# Altium footprint library Toi Library.PcbLib: 740 footprints (part 35 of 47)
Each footprint in its own frame and in the unit in brackets; x right, y up, seen from the top. Pads: shape width x height; smd on the part's side, far side on the other; paste and mask are expansions set on the pad; w line width, h text height; cw(c..) or ccw(c..) is an arc to the next point about the centre after c.
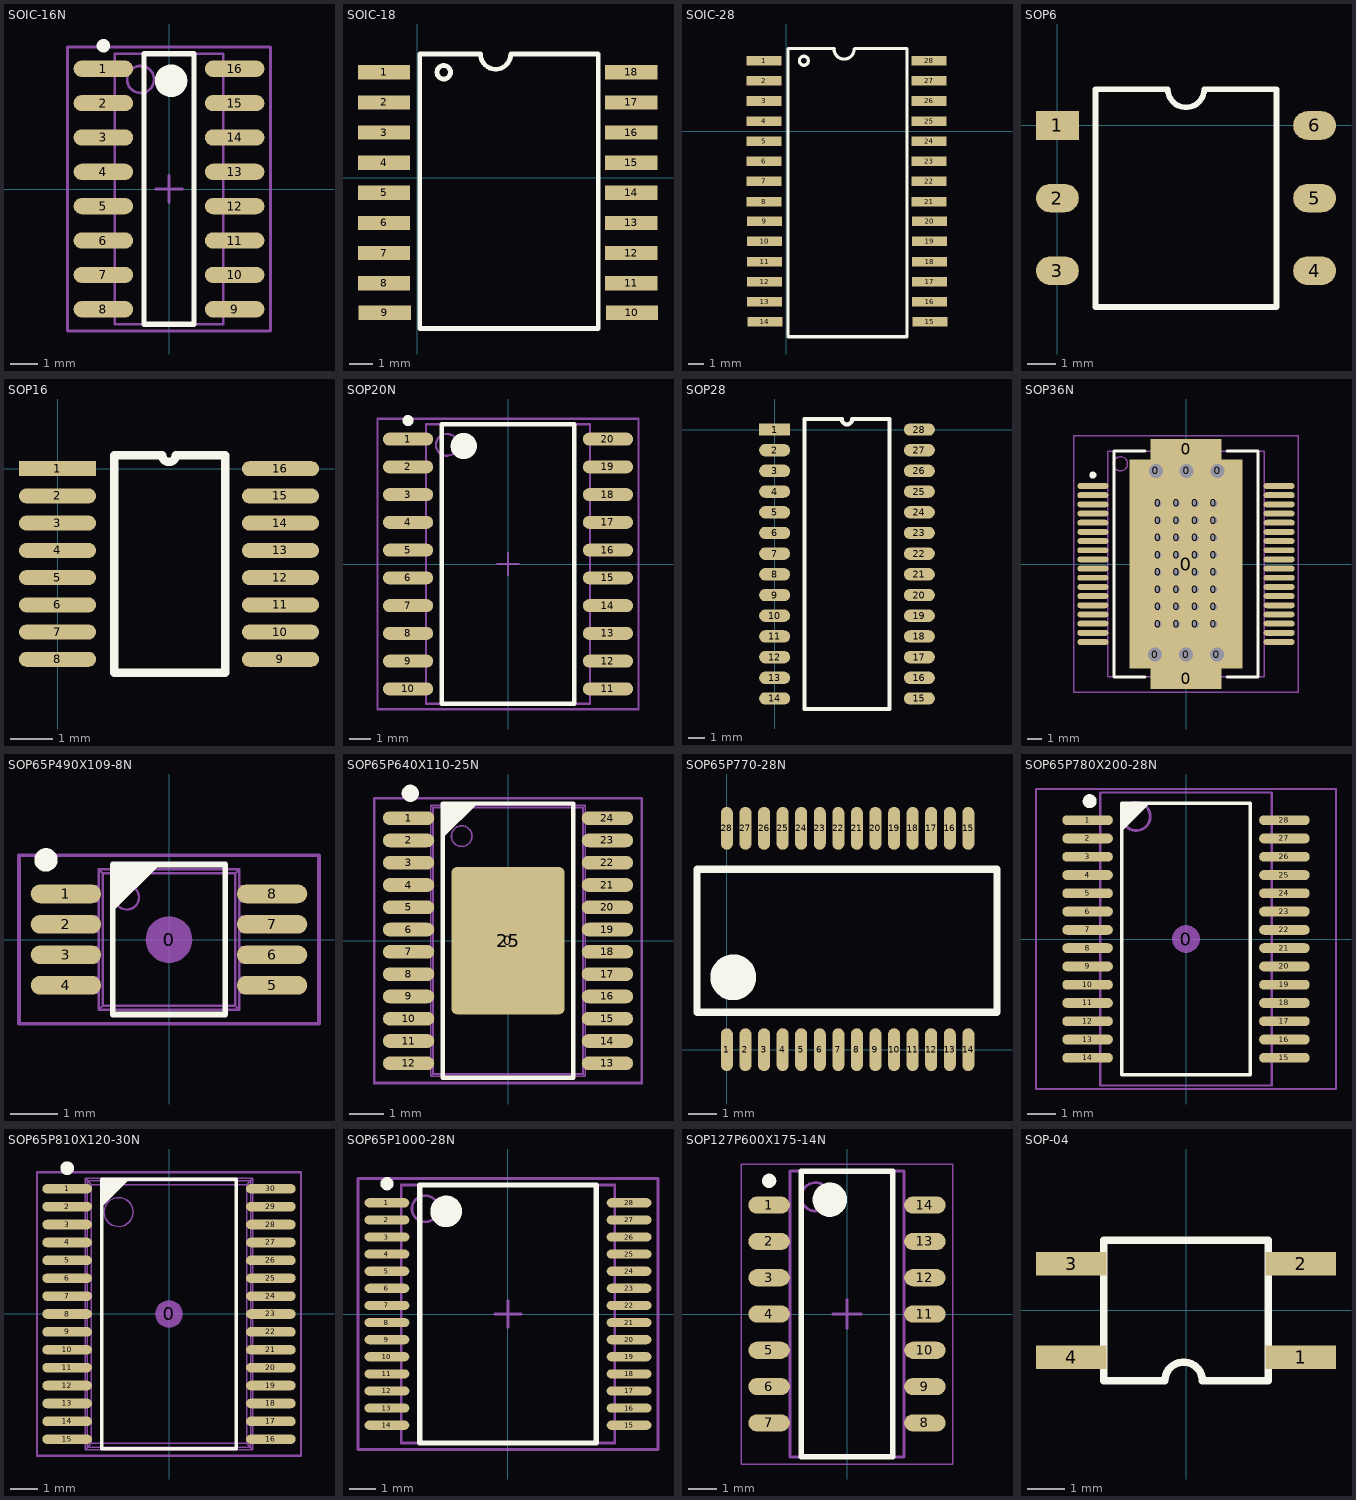
[diagram p34: the footprints below, top view; thin cyan lines are the x and y axes]

## SOIC-16N [mm] "SOIC, 16-Leads, Body 10.0x4.0mm (max), Pitch 1.27mm, IPC Medium Density"
height 1.75
pads (16):
  oval 2.2x0.6 smd: 1(-2.425,4.445) 2(-2.425,3.175) 3(-2.425,1.905) 4(-2.425,0.635) 5(-2.425,-0.635) 6(-2.425,-1.905) 7(-2.425,-3.175) 8(-2.425,-4.445) 9(2.425,-4.445) 10(2.425,-3.175) 11(2.425,-1.905) 12(2.425,-0.635) 13(2.425,0.635) 14(2.425,1.905) 15(2.425,3.175) 16(2.425,4.445)
Top Overlay:
  circle w0.6: c0.075,4 r0.3
  circle w0.25: c-2.425,5.295 r0.125
  lines w0.2: -0.925,-5 0.925,-5 0.925,5 -0.925,5 -0.925,-5
Mechanical 13:
  circle w0.1: c-1.05,4.05 r0.5
  lines w0.1: -2,-5 2,-5 2,5 -2,5 -2,-5
Mechanical 15:
  lines w0.1: -0.5,0 0.5,0 ; 0,-0.5 0,0.5 ; -3.75,-5.25 3.75,-5.25 3.75,5.25 -3.75,5.25 -3.75,-5.25
3D body: height 1.75, standoff 0.1, extent -2,-5 2,5

## SOIC-18 [mm] "Small Outline; 16 Leads; Body Width 7.6 mm; Pitch 1.27 mm"
height 2
pads (18):
  rect 2.2x0.6 smd: 1(-1.398,4.445) 2(-1.398,3.175) 3(-1.398,1.905) 4(-1.398,0.635) 5(-1.398,-0.635) 6(-1.398,-1.905) 7(-1.398,-3.175) 8(-1.398,-4.445) 9(-1.373,-5.69) 10(9.041,-5.69) 11(9.018,-4.445) 12(9.018,-3.175) 13(9.018,-1.905) 14(9.018,-0.635) 15(9.018,0.635) 16(9.018,1.905) 17(9.018,3.175) 18(9.018,4.445)
Top Overlay:
  circle w0.203: c1.113,4.445 r0.284
  lines w0.2: 0.102,5.207 0.102,-6.35 7.62,-6.35 7.62,5.217 3.936,5.217 ; 0.102,5.217 2.666,5.217 ; 2.666,5.207 ccw(c3.301,5.207) 3.936,5.207
3D body "User Library-SOIC-18-300.STEP": height 2.44, standoff -0.16, extent -1.49,-6.637 9.11,5.113

## SOIC-28 [mm] "Small Outline; 16 Leads; Body Width 7.6 mm; Pitch 1.27 mm"
height 2
pads (28):
  rect 2.2x0.6 smd: 1(-1.398,4.445) 2(-1.398,3.175) 3(-1.398,1.905) 4(-1.398,0.635) 5(-1.398,-0.635) 6(-1.398,-1.905) 7(-1.398,-3.175) 8(-1.398,-4.445) 9(-1.373,-5.69) 10(-1.371,-6.96) 11(-1.371,-8.23) 12(-1.371,-9.5) 13(-1.371,-10.77) 14(-1.346,-12.014) 15(9.066,-12.015) 16(9.042,-10.771) 17(9.042,-9.501) 18(9.042,-8.231) 19(9.042,-6.961) 20(9.042,-5.691) 21(9.018,-4.445) 22(9.018,-3.175) 23(9.018,-1.905) 24(9.018,-0.635) 25(9.018,0.635) 26(9.018,1.905) 27(9.018,3.175) 28(9.018,4.445)
Top Overlay:
  circle w0.203: c1.113,4.445 r0.284
  lines w0.2: 3.018,5.183 ccw(c3.653,5.183) 4.288,5.183 ; 3.051,5.217 0.102,5.217 0.102,-12.969 7.62,-12.969 7.62,5.217 4.315,5.217
3D body "User Library-SOIC-28-300.STEP": height 2.44, standoff -0.16, extent -1.537,-12.819 9.063,5.281

## SOP6 [mm]
pads (6):
  rect 1.5x1 smd: 1(0,0)
  oval 1.5x1 smd: 2(0,-2.54) 3(0,-5.08) 4(9,-5.08) 5(9,-2.54) 6(9,0)
Top Overlay:
  lines w0.2: 1.335,-6.35 7.665,-6.35 7.665,1.27 5.135,1.27 cw(c4.5,1.27) 3.865,1.27 1.335,1.27 1.335,-6.35

## SOP16 [mm] "Pin to pin 0.635mm, 16 pin"
pads (16):
  rect 1.8x0.35 smd: 1(0,0)
  oval 1.8x0.35 smd: 2(0,-0.635) 3(0,-1.27) 4(0,-1.905) 5(0,-2.54) 6(0,-3.175) 7(0,-3.81) 8(0,-4.445) 9(5.2,-4.445) 10(5.2,-3.81) 11(5.2,-3.175) 12(5.2,-2.54) 13(5.2,-1.905) 14(5.2,-1.27) 15(5.2,-0.635) 16(5.2,0)
Top Overlay:
  lines w0.2: 1.321,-4.763 1.321,0.318 2.441,0.318 ccw(c2.6,0.318) 2.759,0.317 3.912,0.318 3.912,-4.763 1.321,-4.763

## SOP20N [mm] "SOP, 20-Leads, Body 12.8x7.5mm (max), Pitch 1.27mm, IPC Medium Density"
height 2.65
pads (20):
  oval 2.3x0.6 smd: 1(-4.575,5.715) 2(-4.575,4.445) 3(-4.575,3.175) 4(-4.575,1.905) 5(-4.575,0.635) 6(-4.575,-0.635) 7(-4.575,-1.905) 8(-4.575,-3.175) 9(-4.575,-4.445) 10(-4.575,-5.715) 11(4.575,-5.715) 12(4.575,-4.445) 13(4.575,-3.175) 14(4.575,-1.905) 15(4.575,-0.635) 16(4.575,0.635) 17(4.575,1.905) 18(4.575,3.175) 19(4.575,4.445) 20(4.575,5.715)
Top Overlay:
  circle w0.25: c-4.575,6.565 r0.125
  circle w0.6: c-2.025,5.4 r0.3
  lines w0.2: -3.025,-6.4 -3.025,6.4 3.025,6.4 3.025,-6.4 -3.025,-6.4
Mechanical 13:
  circle w0.1: c-2.8,5.45 r0.5
  lines w0.1: -3.75,-6.4 -3.75,6.4 3.75,6.4 3.75,-6.4 -3.75,-6.4
Mechanical 15:
  lines w0.1: -0.5,0 0.5,0 ; 0,-0.5 0,0.5 ; -5.975,-6.65 -5.975,6.65 5.975,6.65 5.975,-6.65 -5.975,-6.65

## SOP28 [mil]
pads (28):
  rect 75x30 smd: 1(0,0)
  oval 75x30 smd: 2(0,-50) 3(0,-100) 4(0,-150) 5(0,-200) 6(0,-250) 7(0,-300) 8(0,-350) 9(0,-400) 10(0,-450) 11(0,-500) 12(0,-550) 13(0,-600) 14(0,-650) 15(350,-650) 16(350,-600) 17(350,-550) 18(350,-500) 19(350,-450) 20(350,-400) 21(350,-350) 22(350,-300) 23(350,-250) 24(350,-200) 25(350,-150) 26(350,-100) 27(350,-50) 28(350,0)
Top Overlay:
  lines w10: 72.5,-675 277.5,-675 277.5,25 187.5,25 cw(c175,25) 162.5,25 72.5,25 72.5,-675

## SOP36N [mm] "SOP, 36-Leads, Body 15.9x11mm, Pitch 0.65mm, Slug, IPC Medium Density"
height 3.6
pads (77):
  round 1 hole 0.991: 0(-2.184,-6.426) 0(-2.134,6.604) 0(0,-6.426) 0(0.051,6.604) 0(2.184,-6.426) 0(2.235,6.604)
  round 1 hole 0.5: 0(-1.981,-4.267) 0(-1.981,-3.044) 0(-1.981,-1.822) 0(-1.981,-0.599) 0(-1.981,0.624) 0(-1.981,1.847) 0(-1.981,3.07) 0(-1.981,4.293) 0(-0.66,-4.267) 0(-0.66,-3.044) 0(-0.66,-1.822) 0(-0.66,-0.599) 0(-0.66,0.624) 0(-0.66,1.847) 0(-0.66,3.07) 0(-0.66,4.293) 0(0.66,-4.267) 0(0.66,-3.044) 0(0.66,-1.822) 0(0.66,-0.599) 0(0.66,0.624) 0(0.66,1.847) 0(0.66,3.07) 0(0.66,4.293) 0(1.981,-4.267) 0(1.981,-3.044) 0(1.981,-1.822) 0(1.981,-0.599) 0(1.981,0.624) 0(1.981,1.847) 0(1.981,3.07) 0(1.981,4.293)
  rect 5x1.45 smd: 0(0,-8.125) 0(0,8.125)
  rect 8x14.8 smd: 0(0,0)
  oval 2.2x0.42 smd: 1(-6.6,5.525) 2(-6.6,4.875) 3(-6.6,4.225) 4(-6.6,3.575) 5(-6.6,2.925) 6(-6.6,2.275) 7(-6.6,1.625) 8(-6.6,0.975) 9(-6.6,0.325) 10(-6.6,-0.325) 11(-6.6,-0.975) 12(-6.6,-1.625) 13(-6.6,-2.275) 14(-6.6,-2.925) 15(-6.6,-3.575) 16(-6.6,-4.225) 17(-6.6,-4.875) 18(-6.6,-5.525) 19(6.6,-5.525) 20(6.6,-4.875) 21(6.6,-4.225) 22(6.6,-3.575) 23(6.6,-2.925) 24(6.6,-2.275) 25(6.6,-1.625) 26(6.6,-0.975) 27(6.6,-0.325) 28(6.6,0.325) 29(6.6,0.975) 30(6.6,1.625) 31(6.6,2.275) 32(6.6,2.925) 33(6.6,3.575) 34(6.6,4.225) 35(6.6,4.875) 36(6.6,5.525)
Top Overlay:
  circle w0.25: c-6.6,6.3 r0.125
  lines w0.2: -2.9,-8 -5.1,-8 -5.1,8 -2.9,8 ; 2.9,-8 5.1,-8 5.1,8 2.9,8
Mechanical 13:
  circle w0.1: c-4.65,7.1 r0.5
  lines w0.1: -5.55,-8 -5.55,8 5.55,8 5.55,-8 -5.55,-8
Mechanical 15:
  lines w0.1: -0.5,0 0.5,0 ; 0,-0.5 0,0.5 ; -7.95,-9.1 -7.95,9.1 7.95,9.1 7.95,-9.1 -7.95,-9.1
3D body: height 3.6, standoff 0, extent -5.55,-8 5.55,8

## SOP65P490X109-8N [mm] "SOP, 0.65mm pitch, 8 pin, Body 3.0x3.0x1.09mm LWH, IPC Medium Density"
height 1.09
pads (9):
  round 1 on Mech15: 0(0,0)
  oval 1.5x0.4 smd: 1(-2.2,0.975) 2(-2.2,0.325) 3(-2.2,-0.325) 4(-2.2,-0.975) 5(2.2,-0.975) 6(2.2,-0.325) 7(2.2,0.325) 8(2.2,0.975)
Top Overlay:
  circle w0.25: c-2.625,1.7 r0.125
  region: -1.2,1.6 -0.2,1.6 -1.2,0.6
  lines w0.127: -1.2,-1.6 1.2,-1.6 1.2,1.6 -1.2,1.6 -1.2,-1.6
Mechanical 13:
  circle w0.05: c-0.9,0.9 r0.26
  lines w0.05: -2.162,-1.135 -2.162,-0.815 ; -2.162,-0.485 -2.162,-0.165 ; -2.162,0.165 -2.162,0.485 ; -2.162,0.815 -2.162,1.135 ; -2.074,-1.135 -2.074,-0.815 ; -2.074,-0.485 -2.074,-0.165 ; -2.074,0.165 -2.074,0.485 ; -2.074,0.815 -2.074,1.135 ; -2.019,-1.135 -2.019,-0.815 ; -2.019,-0.485 -2.019,-0.165 ; -2.019,0.165 -2.019,0.485 ; -2.019,0.815 -2.019,1.135 ; -1.749,-1.135 -1.749,-0.815 ; -1.749,-0.485 -1.749,-0.165 ; -1.749,0.165 -1.749,0.485 ; -1.749,0.815 -1.749,1.135 ; -1.5,-1.135 -2.45,-1.135 -2.45,-0.815 -1.5,-0.815 ; -1.5,-0.485 -2.45,-0.485 -2.45,-0.165 -1.5,-0.165 ; -1.5,0.165 -2.45,0.165 -2.45,0.485 -1.5,0.485 ; -1.5,0.815 -2.45,0.815 -2.45,1.135 -1.5,1.135 ; 1.5,-1.135 2.45,-1.135 2.45,-0.815 1.5,-0.815 ; 1.5,-0.485 2.45,-0.485 2.45,-0.165 1.5,-0.165 ; 1.5,0.165 2.45,0.165 2.45,0.485 1.5,0.485 ; 1.5,0.815 2.45,0.815 2.45,1.135 1.5,1.135 ; 1.749,-1.135 1.749,-0.815 ; 1.749,-0.485 1.749,-0.165 ; 1.749,0.165 1.749,0.485 ; 1.749,0.815 1.749,1.135 ; 2.019,-1.135 2.019,-0.815 ; 2.019,-0.485 2.019,-0.165 ; 2.019,0.165 2.019,0.485 ; 2.019,0.815 2.019,1.135 ; 2.074,-1.135 2.074,-0.815 ; 2.074,-0.485 2.074,-0.165 ; 2.074,0.165 2.074,0.485 ; 2.074,0.815 2.074,1.135 ; 2.162,-1.135 2.162,-0.815 ; 2.162,-0.485 2.162,-0.165 ; 2.162,0.165 2.162,0.485 ; 2.162,0.815 2.162,1.135 ; -1.5,-1.5 -1.413,-1.413 ; -1.5,-1.5 -1.5,1.5 ; -1.5,-1.5 1.5,-1.5 ; -1.5,1.5 1.5,1.5 ; -1.5,1.5 -1.413,1.413 ; -1.413,-1.413 -1.413,1.413 ; -1.413,-1.413 1.413,-1.413 ; -1.413,1.413 1.413,1.413 ; 1.413,-1.413 1.413,1.413 ; 1.413,-1.413 1.5,-1.5 ; 1.413,1.413 1.5,1.5 ; 1.5,-1.5 1.5,1.5
Mechanical 15:
  lines w0.076: -3.2,-1.8 3.2,-1.8 3.2,1.8 -3.2,1.8 -3.2,-1.8
3D body "MSOP-8.STEP": height 1.1, standoff 0, extent -2.45,-1.5 2.45,1.5

## SOP65P640X110-25N [mm] "TSSOP, 24-Leads, Body 7.9x4.5mm (max), Pitch 0.65mm, IPC Medium Density; JEDEC MO-153"
height 1.1
pads (26):
  round 0.508 on Mech15 mask+0.127: 0(0,0)
  oval 1.5x0.4 smd mask+0.127: 1(-2.9,3.575) 2(-2.9,2.925) 3(-2.9,2.275) 4(-2.9,1.625) 5(-2.9,0.975) 6(-2.9,0.325) 7(-2.9,-0.325) 8(-2.9,-0.975) 9(-2.9,-1.625) 10(-2.9,-2.275) 11(-2.9,-2.925) 12(-2.9,-3.575) 13(2.9,-3.575) 14(2.9,-2.925) 15(2.9,-2.275) 16(2.9,-1.625) 17(2.9,-0.975) 18(2.9,-0.325) 19(2.9,0.325) 20(2.9,0.975) 21(2.9,1.625) 22(2.9,2.275) 23(2.9,2.925) 24(2.9,3.575)
  rrect10% 3.3x4.3 smd paste-0.7: 25(0,0)
Top Overlay:
  circle w0.25: c-2.85,4.3 r0.125
  region: -1.9,4 -0.9,4 -1.9,3
  lines w0.127: -1.9,-4 -1.9,4 1.9,4 1.9,-4 -1.9,-4
Mechanical 13:
  drawing of 181 lines, arcs and shapes, not listed
Mechanical 15:
  lines w0.076: -3.9,-4.15 -3.9,4.15 3.9,4.15 3.9,-4.15 -3.9,-4.15
3D body: height 1.2, standoff 0, extent -3.25,-3.95 3.25,3.95

## SOP65P770-28N [mil]
pads (28):
  oval 16.53x59.03 smd mask+7.9: 1(0,0) 2(25.6,0) 3(51.18,0) 4(76.78,0) 5(102.37,0) 6(127.97,0) 7(153.57,0) 8(179.15,0) 9(204.75,0) 10(230.35,0) 11(255.93,0) 12(281.53,0) 13(307.12,0) 14(332.7,0) 15(332.7,305) 16(307.12,305) 17(281.53,305) 18(255.93,305) 19(230.35,305) 20(204.75,305) 21(179.15,305) 22(153.57,305) 23(127.97,305) 24(102.37,305) 25(76.78,305) 26(51.18,305) 27(25.6,305) 28(0,305)
Top Overlay:
  circle w39.37: c8.8,99.7 r11.88
  lines w10: -41.22,51.66 -41.22,248.53 372.21,248.53 372.21,51.66 -41.22,51.66
3D body "SOP65P770x200-28N.step": height 84.65, standoff 0, extent -37.01,0.01 369.69,305.35

## SOP65P780X200-28N [mm] "SOP, 28 Leads, Body 10.2x5.3mm, Pitch 0.65mm, IPC Medium Density"
height 2
pads (29):
  round 1 on Mech15: 0(0,0)
  oval 1.8x0.35 smd: 1(-3.5,4.225) 2(-3.5,3.575) 3(-3.5,2.925) 4(-3.5,2.275) 5(-3.5,1.625) 6(-3.5,0.975) 7(-3.5,0.325) 8(-3.5,-0.325) 9(-3.5,-0.975) 10(-3.5,-1.625) 11(-3.5,-2.275) 12(-3.5,-2.925) 13(-3.5,-3.575) 14(-3.5,-4.225) 15(3.5,-4.225) 16(3.5,-3.575) 17(3.5,-2.925) 18(3.5,-2.275) 19(3.5,-1.625) 20(3.5,-0.975) 21(3.5,-0.325) 22(3.5,0.325) 23(3.5,0.975) 24(3.5,1.625) 25(3.5,2.275) 26(3.5,2.925) 27(3.5,3.575) 28(3.5,4.225)
Top Overlay:
  circle w0.25: c-3.425,4.9 r0.125
  region: -2.286,4.826 -1.286,4.826 -2.286,3.826
  lines w0.127: -2.286,-4.826 2.286,-4.826 2.286,4.826 -2.286,4.826 -2.286,-4.826
Mechanical 13:
  circle w0.1: c-1.77,4.355 r0.5
  lines w0.076: -3.048,-5.207 3.048,-5.207 3.048,5.207 -3.048,5.207 -3.048,-5.207
Mechanical 15:
  lines w0.076: -5.334,-5.334 5.334,-5.334 5.334,5.334 -5.334,5.334 -5.334,-5.334
3D body "SOP65P780X200-28N.stp": height 1.88, standoff 0, extent -3.903,-5.1 3.903,5.1

## SOP65P810X120-30N [mm] "SOP, 30-Leads, Body 9.8x6.2mm (max), Pitch 0.65mm, IPC Medium Density"
height 1.2
pads (31):
  round 1 on Mech15: 0(0,0)
  oval 1.8x0.35 smd mask+0.152: 1(-3.7,4.55) 2(-3.7,3.9) 3(-3.7,3.25) 4(-3.7,2.6) 5(-3.7,1.95) 6(-3.7,1.3) 7(-3.7,0.65) 8(-3.7,0) 9(-3.7,-0.65) 10(-3.7,-1.3) 11(-3.7,-1.95) 12(-3.7,-2.6) 13(-3.7,-3.25) 14(-3.7,-3.9) 15(-3.7,-4.55) 16(3.7,-4.55) 17(3.7,-3.9) 18(3.7,-3.25) 19(3.7,-2.6) 20(3.7,-1.95) 21(3.7,-1.3) 22(3.7,-0.65) 23(3.7,0) 24(3.7,0.65) 25(3.7,1.3) 26(3.7,1.95) 27(3.7,2.6) 28(3.7,3.25) 29(3.7,3.9) 30(3.7,4.55)
Top Overlay:
  circle w0.25: c-3.7,5.3 r0.125
  region: -2.45,4.9 -1.45,4.9 -2.45,3.9
  lines w0.127: -2.45,-4.9 2.45,-4.9 2.45,4.9 -2.45,4.9 -2.45,-4.9
Mechanical 13:
  drawing of 227 lines, arcs and shapes, not listed
Mechanical 15:
  lines w0.076: -4.8,-5.15 4.8,-5.15 4.8,5.15 -4.8,5.15 -4.8,-5.15
3D body "LSSOP-30.STEP": height 1.3, standoff 0, extent -4.05,-4.925 4.05,4.925

## SOP65P1000-28N [mm] "SOP, 28-Leads, Body 9.7x8mm, Pitch 0.65mm, IPC Medium Density"
height 2
pads (28):
  oval 1.7x0.35 smd: 1(-4.6,4.225) 2(-4.6,3.575) 3(-4.6,2.925) 4(-4.6,2.275) 5(-4.6,1.625) 6(-4.6,0.975) 7(-4.6,0.325) 8(-4.6,-0.325) 9(-4.6,-0.975) 10(-4.6,-1.625) 11(-4.6,-2.275) 12(-4.6,-2.925) 13(-4.6,-3.575) 14(-4.6,-4.225) 15(4.6,-4.225) 16(4.6,-3.575) 17(4.6,-2.925) 18(4.6,-2.275) 19(4.6,-1.625) 20(4.6,-0.975) 21(4.6,-0.325) 22(4.6,0.325) 23(4.6,0.975) 24(4.6,1.625) 25(4.6,2.275) 26(4.6,2.925) 27(4.6,3.575) 28(4.6,4.225)
Top Overlay:
  circle w0.6: c-2.35,3.9 r0.3
  circle w0.25: c-4.6,4.95 r0.125
  lines w0.2: -3.35,-4.9 3.35,-4.9 3.35,4.9 -3.35,4.9 -3.35,-4.9
Mechanical 13:
  circle w0.1: c-3.15,4 r0.5
  lines w0.1: -4.05,-4.9 4.05,-4.9 4.05,4.9 -4.05,4.9 -4.05,-4.9
Mechanical 15:
  lines w0.1: -0.5,0 0.5,0 ; 0,-0.5 0,0.5 ; -5.7,-5.15 5.7,-5.15 5.7,5.15 -5.7,5.15 -5.7,-5.15
3D body: height 2, standoff 0, extent -4.05,-4.9 4.05,4.9

## SOP127P600X175-14N [mm] "SOP, 14-Leads, Body 9.90x3.90mm, Pitch 1.27mm, IPC Medium Density"
height 1.75
pads (14):
  oval 1.45x0.6 smd: 1(-2.725,3.81) 2(-2.725,2.54) 3(-2.725,1.27) 4(-2.725,0) 5(-2.725,-1.27) 6(-2.725,-2.54) 7(-2.725,-3.81) 8(2.725,-3.81) 9(2.725,-2.54) 10(2.725,-1.27) 11(2.725,0) 12(2.725,1.27) 13(2.725,2.54) 14(2.725,3.81)
Top Overlay:
  circle w0.25: c-2.725,4.66 r0.125
  circle w0.6: c-0.6,4 r0.3
  lines w0.2: -1.6,-5 -1.6,5 1.6,5 1.6,-5 -1.6,-5
Mechanical 13:
  circle w0.1: c-1.1,4.1 r0.5
  lines w0.1: -2,-5 -2,5 2,5 2,-5 -2,-5
Mechanical 15:
  lines w0.05: -3.7,-5.25 -3.7,5.25 3.7,5.25 3.7,-5.25 -3.7,-5.25
  lines w0.1: -0.5,0 0.5,0 ; 0,-0.5 0,0.5
3D body: height 1.75, standoff 0, extent -3,-5 3,5

## SOP-04 [mil]
pads (4):
  rect 75x25 smd: 1(122.5,-50) 2(122.5,50) 3(-122.5,50) 4(-122.5,-50)
Top Overlay:
  lines w8: -87.5,-75 -87.5,75 87.5,75 87.5,-75 17.5,-75 ccw(c-2.5,-75) -22.5,-75 -87.5,-75
3D body: height 98.43, standoff 0, extent -87.52,-75.02 87.52,75.02